# Altium footprint library 音频功放自画库.PcbLib: 2 footprints
Each footprint in its own frame and in the unit in brackets; x right, y up, seen from the top. Pads: shape width x height; smd on the part's side, far side on the other; paste and mask are expansions set on the pad; w line width, h text height; cw(c..) or ccw(c..) is an arc to the next point about the centre after c.
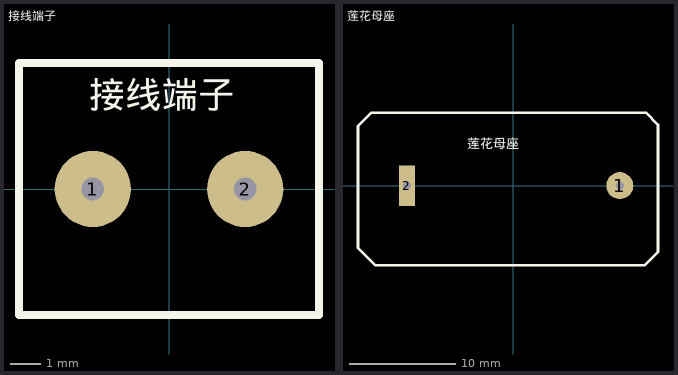
[diagram p0: the footprints below, top view; thin cyan lines are the x and y axes]

## 接线端子 [mil]
pads (2):
  round 100 hole 30: 1(-100,0) 2(100,0)
Top Overlay:
  lines w10: -196.85,-165.35 196.85,-165.35 196.85,165.35 -196.85,165.35 -196.85,-165.35
  text "接线端子" at -105,95 h60

## 莲花母座 [mil] "莲花插座"
pads (2):
  round 100 hole 30: 1(393.7,0)
  rect 60x150 hole 30: 2(-393.7,0)
Top Overlay:
  lines w10: -575,-230 -510,-295 -107.5,-295 485,-295 535,-245 535,-150 535,225 490,270 -525,270 -575,220 -575,-230
  text "莲花母座" at -170,125 h60